# Altium integrated library HCxx.IntLib: 212 symbols (part 2 of 2)
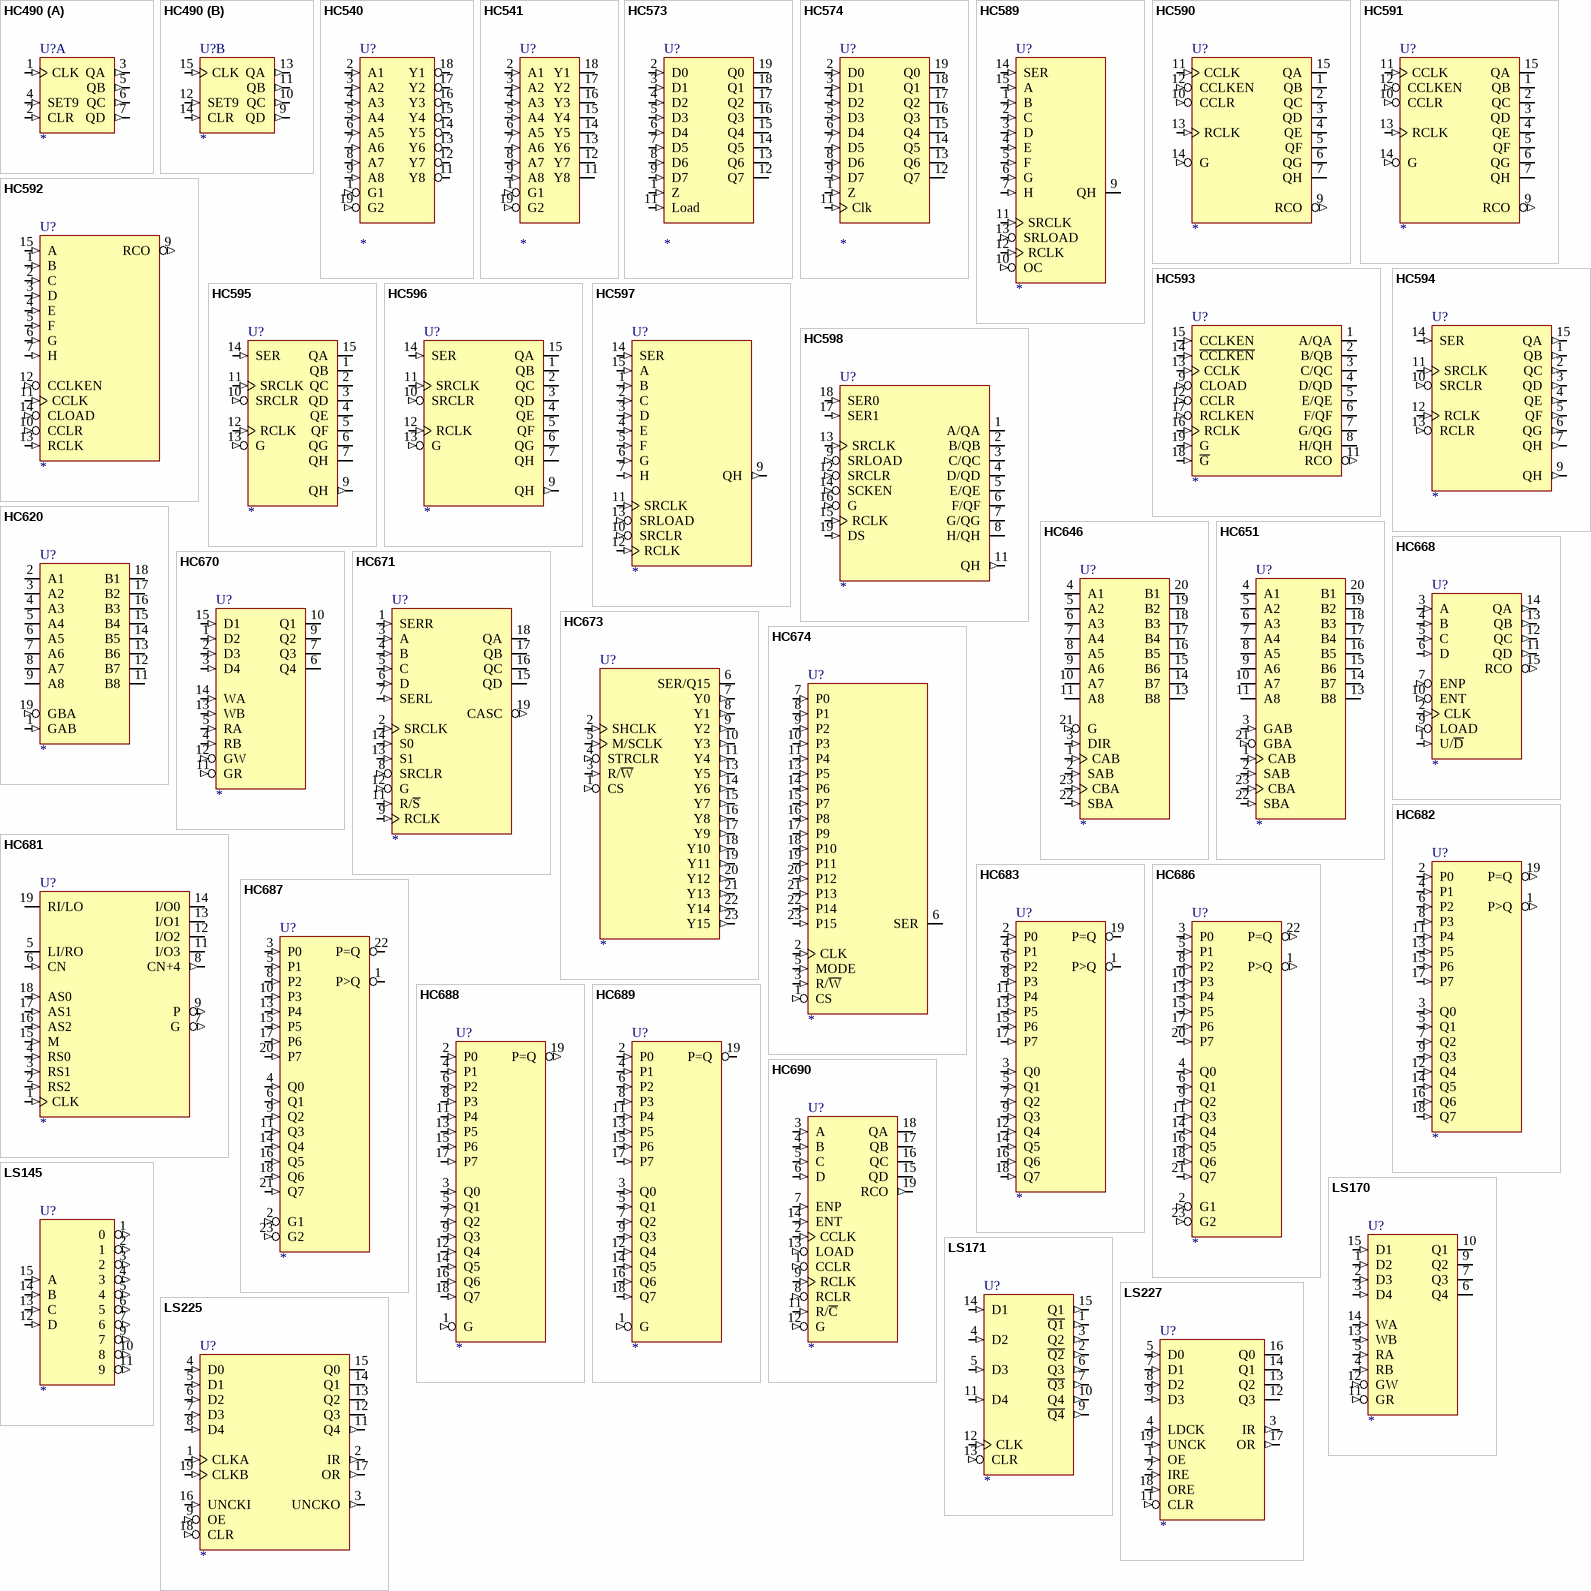
[diagram p9: symbols HC490 to LS227]

## HC686
designator U?
footprint DIL24-300 (Footprint not found)
pins: 1 P>Q (out), 2 G1 (in), 3 P0 (in), 4 Q0 (in), 5 P1 (in), 6 Q1 (in), 8 P2 (in), 9 Q2 (in), 10 P3 (in), 11 Q3 (in), 12 GND (power) hidden to GND, 13 P4 (in), 14 Q4 (in), 15 P5 (in), 16 Q5 (in), 17 P6 (in), 18 Q6 (in), 20 P7 (in), 21 Q7 (in), 22 P=Q (out), 23 G2 (in), 24 VCC (power) hidden to VCC

## HC687
designator U?
footprint DIL24-300 (Footprint not found)
pins: 1 P>Q (oc), 2 G1 (in), 3 P0 (in), 4 Q0 (in), 5 P1 (in), 6 Q1 (in), 8 P2 (in), 9 Q2 (in), 10 P3 (in), 11 Q3 (in), 12 GND (power) hidden to GND, 13 P4 (in), 14 Q4 (in), 15 P5 (in), 16 Q5 (in), 17 P6 (in), 18 Q6 (in), 20 P7 (in), 21 Q7 (in), 22 P=Q (oc), 23 G2 (in), 24 VCC (power) hidden to VCC

## HC688
designator U?
footprint DIL20-300
pins: 1 G (in), 2 P0 (in), 3 Q0 (in), 4 P1 (in), 5 Q1 (in), 6 P2 (in), 7 Q2 (in), 8 P3 (in), 9 Q3 (in), 10 GND (power) hidden to GND, 11 P4 (in), 12 Q4 (in), 13 P5 (in), 14 Q5 (in), 15 P6 (in), 16 Q6 (in), 17 P7 (in), 18 Q7 (in), 19 P=Q (out), 20 VCC (power) hidden to VCC

## HC689
designator U?
footprint DIL20-300
pins: 1 G (in), 2 P0 (in), 3 Q0 (in), 4 P1 (in), 5 Q1 (in), 6 P2 (in), 7 Q2 (in), 8 P3 (in), 9 Q3 (in), 10 GND (power) hidden to GND, 11 P4 (in), 12 Q4 (in), 13 P5 (in), 14 Q5 (in), 15 P6 (in), 16 Q6 (in), 17 P7 (in), 18 Q7 (in), 19 P=Q (oc), 20 VCC (power) hidden to VCC

## HC690
designator U?
footprint DIL20-300
pins: 1 CCLR (in), 2 CCLK (in), 3 A (in), 4 B (in), 5 C (in), 6 D (in), 7 ENP (in), 8 RCLR (in), 9 RCLK (in), 10 GND (power) hidden to GND, 11 R/~{C} (in), 12 G (in), 13 LOAD (in), 14 ENT (in), 15 QD (hiz), 16 QC (hiz), 17 QB (hiz), 18 QA (hiz), 19 RCO (out), 20 VCC (power) hidden to VCC

## LS145
designator U?
footprint DIL16-300
pins: 1 0 (out), 2 1 (out), 3 2 (out), 4 3 (out), 5 4 (out), 6 5 (out), 7 6 (out), 8 GND (power) hidden to GND, 9 7 (out), 10 8 (out), 11 9 (out), 12 D (in), 13 C (in), 14 B (in), 15 A (in), 16 VCC (power) hidden to VCC

## LS170
designator U?
footprint DIL16-300
pins: 1 D2 (in), 2 D3 (in), 3 D4 (in), 4 RB (in), 5 RA (in), 6 Q4 (oc), 7 Q3 (oc), 8 GND (power) hidden to GND, 9 Q2 (oc), 10 Q1 (oc), 11 GR (in), 12 GW (in), 13 WB (in), 14 WA (in), 15 D1 (in), 16 VCC (power) hidden to VCC

## LS171
designator U?
footprint DIL16-300
pins: 1 ~{Q1} (out), 2 ~{Q2} (out), 3 Q2 (out), 4 D2 (in), 5 D3 (in), 6 Q3 (out), 7 ~{Q3} (out), 8 GND (power) hidden to GND, 9 ~{Q4} (out), 10 Q4 (out), 11 D4 (in), 12 CLK (in), 13 CLR (in), 14 D1 (in), 15 Q1 (out), 16 VCC (power) hidden to VCC

## LS225
designator U?
footprint DIL20-300
pins: 1 CLKA (in), 2 IR (out), 3 UNCKO (out), 4 D0 (in), 5 D1 (in), 6 D2 (in), 7 D3 (in), 8 D4 (in), 9 OE (in), 10 GND (power) hidden to GND, 11 Q4 (out), 12 Q3 (oc), 13 Q2 (oc), 14 Q1 (oc), 15 Q0 (oc), 16 UNCKI (in), 17 OR (out), 18 CLR (in), 19 CLKB (in), 20 VCC (power) hidden to VCC

## LS227
designator U?
footprint DIL20-300
pins: 1 OE (in), 2 IRE (in), 3 IR (out), 4 LDCK (in), 5 D0 (in), 7 D1 (in), 8 D2 (in), 9 D3 (in), 10 GND (power) hidden to GND, 11 CLR (in), 12 Q3 (oc), 13 Q2 (oc), 14 Q1 (oc), 16 Q0 (oc), 17 OR (out), 18 ORE (in), 19 UNCK (in), 20 VCC (power) hidden to VCC

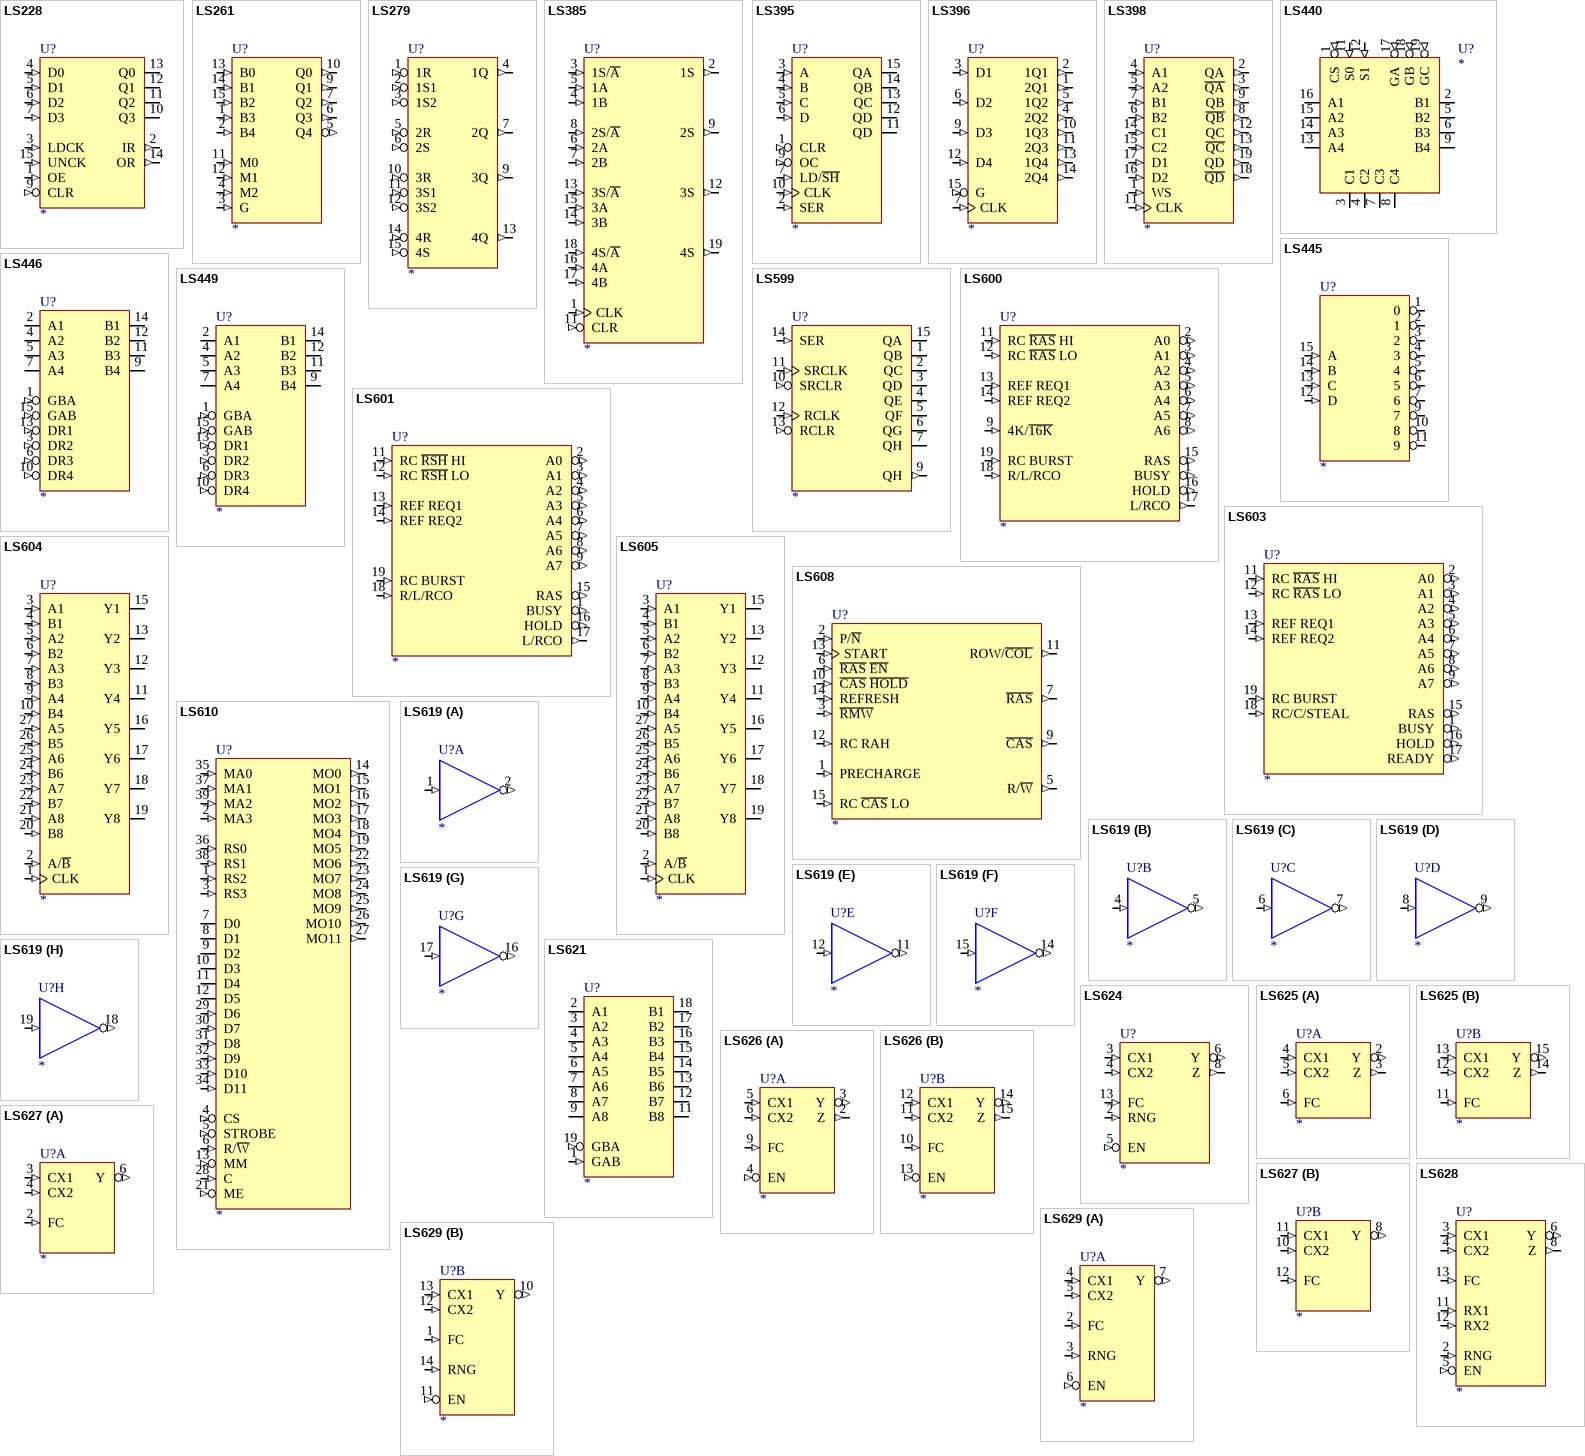
[diagram p7: symbols LS228 to LS629]

## LS228
designator U?
footprint DIL16-300
pins: 1 OE (in), 2 IR (out), 3 LDCK (in), 4 D0 (in), 5 D1 (in), 6 D2 (in), 7 D3 (in), 8 GND (power) hidden to GND, 9 CLR (in), 10 Q3 (oc), 11 Q2 (oc), 12 Q1 (oc), 13 Q0 (oc), 14 OR (out), 15 UNCK (in), 16 VCC (power) hidden to VCC

## LS261
designator U?
footprint DIL16-300
pins: 1 B3 (in), 2 B4 (in), 3 G (in), 4 M2 (in), 5 Q4 (out), 6 Q3 (out), 7 Q2 (out), 8 GND (power) hidden to GND, 9 Q1 (out), 10 Q0 (out), 11 M0 (in), 12 M1 (in), 13 B0 (in), 14 B1 (in), 15 B2 (in), 16 VCC (power) hidden to VCC

## LS279
designator U?
footprint DIL16-300
pins: 1 1R (in), 2 1S1 (in), 3 1S2 (in), 4 1Q (out), 5 2R (in), 6 2S (in), 7 2Q (out), 8 GND (power) hidden to GND, 9 3Q (out), 10 3R (in), 11 3S1 (in), 12 3S2 (in), 13 4Q (out), 14 4R (in), 15 4S (in), 16 VCC (power) hidden to VCC

## LS385
designator U?
footprint DIL20-300
pins: 1 CLK (in), 2 1S (out), 3 1S/~{A} (in), 4 1B (in), 5 1A (in), 6 2A (in), 7 2B (in), 8 2S/~{A} (in), 9 2S (out), 10 GND (power) hidden to GND, 11 CLR (in), 12 3S (out), 13 3S/~{A} (in), 14 3B (in), 15 3A (in), 16 4A (in), 17 4B (in), 18 4S/~{A} (in), 19 4S (out), 20 VCC (power) hidden to VCC

## LS395
designator U?
footprint DIL16-300
pins: 1 CLR (in), 2 SER (in), 3 A (in), 4 B (in), 5 C (in), 6 D (in), 7 LD/~{SH} (in), 8 GND (power) hidden to GND, 9 OC (in), 10 CLK (in), 11 QD (hiz), 12 QD (hiz), 13 QC (hiz), 14 QB (hiz), 15 QA (hiz), 16 VCC (power) hidden to VCC

## LS396
designator U?
footprint DIL16-300
pins: 1 2Q1 (out), 2 1Q1 (out), 3 D1 (in), 4 2Q2 (out), 5 1Q2 (out), 6 D2 (in), 7 CLK (in), 8 GND (power) hidden to GND, 9 D3 (in), 10 1Q3 (out), 11 2Q3 (out), 12 D4 (in), 13 1Q4 (out), 14 2Q4 (out), 15 G (in), 16 VCC (power) hidden to VCC

## LS398
designator U?
footprint DIL20-300
pins: 1 WS (in), 2 QA (out), 3 ~{QA} (out), 4 A1 (in), 5 A2 (in), 6 B2 (in), 7 B1 (in), 8 ~{QB} (out), 9 QB (out), 10 GND (power) hidden to GND, 11 CLK (in), 12 QC (out), 13 ~{QC} (out), 14 C1 (in), 15 C2 (in), 16 D2 (in), 17 D1 (in), 18 ~{QD} (out), 19 QD (out), 20 VCC (power) hidden to VCC

## LS440
designator U?
footprint DIL20-300
pins: 1 CS (in), 2 B1 (io), 3 C1 (io), 4 C2 (io), 5 B2 (io), 6 B3 (io), 7 C3 (io), 8 C4 (io), 9 B4 (io), 10 GND (power) hidden to GND, 11 S0 (in), 12 S1 (in), 13 A4 (io), 14 A3 (io), 15 A2 (io), 16 A1 (io), 17 GA (in), 18 GB (in), 19 GC (in), 20 VCC (power) hidden to VCC

## LS445
designator U?
footprint DIL16-300
pins: 1 0 (oc), 2 1 (oc), 3 2 (oc), 4 3 (oc), 5 4 (oc), 6 5 (oc), 7 6 (oc), 8 GND (power) hidden to GND, 9 7 (oc), 10 8 (oc), 11 9 (oc), 12 D (in), 13 C (in), 14 B (in), 15 A (in), 16 VCC (power) hidden to VCC

## LS446
designator U?
footprint DIL16-300
pins: 1 GBA (in), 2 A1 (io), 3 DR2 (in), 4 A2 (io), 5 A3 (io), 6 DR3 (in), 7 A4 (io), 8 GND (power) hidden to GND, 9 B4 (io), 10 DR4 (in), 11 B3 (io), 12 B2 (io), 13 DR1 (in), 14 B1 (io), 15 GAB (in), 16 VCC (power) hidden to VCC

## LS449
designator U?
footprint DIL16-300
pins: 1 GBA (in), 2 A1 (io), 3 DR2 (in), 4 A2 (io), 5 A3 (io), 6 DR3 (in), 7 A4 (io), 8 GND (power) hidden to GND, 9 B4 (io), 10 DR4 (in), 11 B3 (io), 12 B2 (io), 13 DR1 (in), 14 B1 (io), 15 GAB (in), 16 VCC (power) hidden to VCC

## LS599
designator U?
footprint DIL16-300
pins: 1 QB (oc), 2 QC (oc), 3 QD (oc), 4 QE (oc), 5 QF (oc), 6 QG (oc), 7 QH (oc), 8 GND (power) hidden to GND, 9 QH (out), 10 SRCLR (in), 11 SRCLK (in), 12 RCLK (in), 13 RCLR (in), 14 SER (in), 15 QA (oc), 16 VCC (power) hidden to VCC

## LS600
designator U?
footprint DIL20-300
pins: 1 BUSY (out), 2 A0 (out), 3 A1 (out), 4 A2 (out), 5 A3 (out), 6 A4 (out), 7 A5 (out), 8 A6 (out), 9 4K/~{16K} (in), 10 GND (power) hidden to GND, 11 RC ~{RAS} HI (in), 12 RC ~{RAS} LO (in), 13 REF REQ1 (in), 14 REF REQ2 (in), 15 RAS (out), 16 HOLD (out), 17 L/RCO (out), 18 R/L/RCO (in), 19 RC BURST (in), 20 VCC (power) hidden to VCC

## LS601
designator U?
footprint DIL20-300
pins: 1 BUSY (out), 2 A0 (out), 3 A1 (out), 4 A2 (out), 5 A3 (out), 6 A4 (out), 7 A5 (out), 8 A6 (out), 9 A7 (out), 10 GND (power) hidden to GND, 11 RC ~{RSH} HI (in), 12 RC ~{RSH} LO (in), 13 REF REQ1 (in), 14 REF REQ2 (in), 15 RAS (out), 16 HOLD (out), 17 L/RCO (out), 18 R/L/RCO (in), 19 RC BURST (in), 20 VCC (power) hidden to VCC

## LS603
designator U?
footprint DIL20-300
pins: 1 BUSY (out), 2 A0 (out), 3 A1 (out), 4 A2 (out), 5 A3 (out), 6 A4 (out), 7 A5 (out), 8 A6 (out), 9 A7 (out), 10 GND (power) hidden to GND, 11 RC ~{RAS} HI (in), 12 RC ~{RAS} LO (in), 13 REF REQ1 (in), 14 REF REQ2 (in), 15 RAS (out), 16 HOLD (out), 17 READY (out), 18 RC/C/STEAL (in), 19 RC BURST (in), 20 VCC (power) hidden to VCC

## LS604
designator U?
footprint DIL28-300 (Footprint not found)
pins: 1 CLK (in), 2 A/~{B} (in), 3 A1 (in), 4 B1 (in), 5 A2 (in), 6 B2 (in), 7 A3 (in), 8 B3 (in), 9 A4 (in), 10 B4 (in), 11 Y4 (hiz), 12 Y3 (hiz), 13 Y2 (hiz), 14 GND (power) hidden to GND, 15 Y1 (hiz), 16 Y5 (hiz), 17 Y6 (hiz), 18 Y7 (hiz), 19 Y8 (hiz), 20 B8 (in), 21 A8 (in), 22 B7 (in), 23 A7 (in), 24 B6 (in), 25 A6 (in), 26 B5 (in), 27 A5 (in), 28 VCC (power) hidden to VCC

## LS605
designator U?
footprint DIL28-300 (Footprint not found)
pins: 1 CLK (in), 2 A/~{B} (in), 3 A1 (in), 4 B1 (in), 5 A2 (in), 6 B2 (in), 7 A3 (in), 8 B3 (in), 9 A4 (in), 10 B4 (in), 11 Y4 (oc), 12 Y3 (oc), 13 Y2 (oc), 14 GND (power) hidden to GND, 15 Y1 (oc), 16 Y5 (oc), 17 Y6 (oc), 18 Y7 (oc), 19 Y8 (oc), 20 B8 (in), 21 A8 (in), 22 B7 (in), 23 A7 (in), 24 B6 (in), 25 A6 (in), 26 B5 (in), 27 A5 (in), 28 VCC (power) hidden to VCC

## LS608
designator U?
footprint DIL16-300
pins: 1 PRECHARGE (in), 2 P/~{N} (in), 3 ~{RMW} (in), 5 R/~{W} (out), 6 ~{RAS} ~{EN} (in), 7 ~{RAS} (out), 8 GND (power) hidden to GND, 9 ~{CAS} (out), 10 ~{CAS} ~{HOLD} (in), 11 ROW/~{COL} (out), 12 RC RAH (in), 13 START (in), 14 REFRESH (in), 15 RC ~{CAS} LO (in), 16 VCC (power) hidden to VCC

## LS610
designator U?
footprint DIL40-600
pins: 1 RS2 (in), 2 MA3 (in), 3 RS3 (in), 4 CS (in), 5 STROBE (in), 6 R/~{W} (in), 7 D0 (io), 8 D1 (io), 9 D2 (io), 10 D3 (io), 11 D4 (io), 12 D5 (io), 13 MM (in), 14 MO0 (out), 15 MO1 (out), 16 MO2 (out), 17 MO3 (out), 18 MO4 (out), 19 MO5 (out), 20 GND (power) hidden to GND, 21 ME (in), 22 MO6 (out), 23 MO7 (out), 24 MO8 (out), 25 MO9 (out), 26 MO10 (out), 27 MO11 (out), 28 C (in), 29 D6 (in), 30 D7 (in), 31 D8 (in), 32 D9 (in), 33 D10 (in), 34 D11 (in), 35 MA0 (in), 36 RS0 (in), 37 MA1 (in), 38 RS1 (in), 39 MA2 (in), 40 VCC (power) hidden to VCC

## LS619
designator U?
footprint DIL20-300
part A pins: 1 I (in), 2 O (out), 10 GND (power) hidden to GND, 20 VCC (power) hidden to VCC
part B pins: 4 I (in), 5 O (out)
part C pins: 6 I (in), 7 O (out)
part D pins: 8 I (in), 9 O (out)
part E pins: 11 O (out), 12 I (in)
part F pins: 14 O (out), 15 I (in)
part G pins: 16 O (out), 17 I (in)
part H pins: 18 O (out), 19 I (in)
1 alternate drawing of the same symbol

## LS621
designator U?
footprint DIL20-300
pins: 1 GAB (in), 2 A1 (oc), 3 A2 (oc), 4 A3 (oc), 5 A4 (oc), 6 A5 (oc), 7 A6 (oc), 8 A7 (oc), 9 A8 (oc), 10 GND (power) hidden to GND, 11 B8 (oc), 12 B7 (oc), 13 B6 (oc), 14 B5 (oc), 15 B4 (oc), 16 B3 (oc), 17 B2 (oc), 18 B1 (oc), 19 GBA (in), 20 VCC (power) hidden to VCC

## LS624
designator U?
footprint DIL14-300
pins: 1 OSCGND (power) hidden to OSCGND, 2 RNG (in), 3 CX1 (in), 4 CX2 (in), 5 EN (in), 6 Y (out), 7 GND (power) hidden to GND, 8 Z (out), 9 VCC (power) hidden to VCC, 13 FC (in), 14 OSCVCC (power) hidden to OSCVCC

## LS625
designator U?
footprint DIL16-300
part A pins: 1 Gnd (power) hidden to GND, 2 Y (out), 3 Z (out), 4 CX1 (in), 5 CX2 (in), 6 FC (in), 7 OSCVCC (power) hidden to OSCVCC, 8 OSCGND (power) hidden to OSCGND, 16 VCC (power) hidden to VCC
part B pins: 9 OSCGND (power) hidden to OSCGND, 10 OSCVCC (power) hidden to OSCVCC, 11 FC (in), 12 CX2 (in), 13 CX1 (in), 14 Z (out), 15 Y (out)

## LS626
designator U?
footprint DIL16-300
part A pins: 1 GND (power) hidden to GND, 2 Z (out), 3 Y (out), 4 EN (in), 5 CX1 (in), 6 CX2 (in), 7 OSCVCC (power) hidden to OSCVCC, 8 OSCGND (power) hidden to OSCGND, 9 FC (in), 16 VCC (power) hidden to VCC
part B pins: 10 FC (in), 11 CX2 (in), 12 CX1 (in), 13 EN (in), 14 Y (out), 15 Z (out)

## LS627
designator U?
footprint DIL14-300
part A pins: 1 OSCVCC (power) hidden to OSCVCC, 2 FC (in), 3 CX1 (in), 4 CX2 (in), 5 OSCGND (power) hidden to OSCGND, 6 Y (out), 7 GND (power) hidden to GND, 14 VCC (power) hidden to VCC
part B pins: 8 Y (out), 9 OSCGND (power) hidden to OSCGND, 10 CX2 (in), 11 CX1 (in), 12 FC (in), 13 OSCVCC (power) hidden to OSCVCC

## LS628
designator U?
footprint DIL14-300
pins: 1 OSCGND (power) hidden to OSCGND, 2 RNG (in), 3 CX1 (in), 4 CX2 (in), 5 EN (in), 6 Y (out), 7 GND (power) hidden to GND, 8 Z (out), 9 VCC (power) hidden to VCC, 11 RX1 (in), 12 RX2 (in), 13 FC (in), 14 OSCVCC (power) hidden to OSCVCC

## LS629
designator U?
footprint DIL16-300
part A pins: 2 FC (in), 3 RNG (in), 4 CX1 (in), 5 CX2 (in), 6 EN (in), 7 Y (out), 8 OSCGND (power) hidden to OSCGND, 9 GND (power) hidden to GND, 15 OSCVCC (power) hidden to OSCVCC, 16 VCC (power) hidden to VCC
part B pins: 1 FC (in), 10 Y (out), 11 EN (in), 12 CX2 (in), 13 CX1 (in), 14 RNG (in)

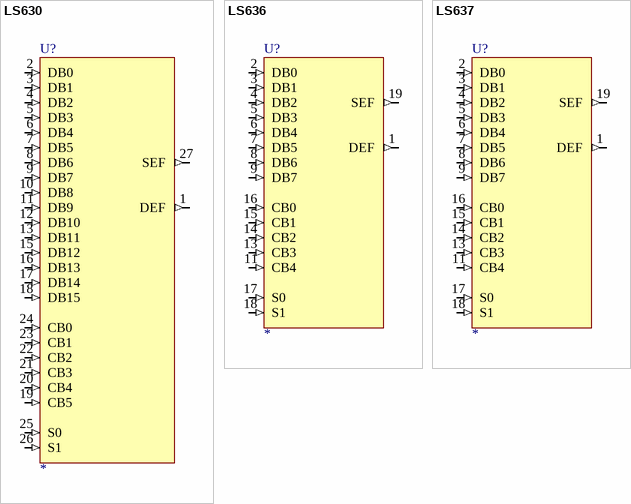
[diagram p8: symbols LS630 to LS637]

## LS630
designator U?
footprint DIL28-300 (Footprint not found)
pins: 1 DEF (out), 2 DB0 (in), 3 DB1 (in), 4 DB2 (in), 5 DB3 (in), 6 DB4 (in), 7 DB5 (in), 8 DB6 (in), 9 DB7 (in), 10 DB8 (in), 11 DB9 (in), 12 DB10 (in), 13 DB11 (in), 14 GND (power) hidden to GND, 15 DB12 (in), 16 DB13 (in), 17 DB14 (in), 18 DB15 (in), 19 CB5 (in), 20 CB4 (in), 21 CB3 (in), 22 CB2 (in), 23 CB1 (in), 24 CB0 (in), 25 S0 (in), 26 S1 (in), 27 SEF (out), 28 VCC (power) hidden to VCC

## LS636
designator U?
footprint DIL20-300
pins: 1 DEF (out), 2 DB0 (in), 3 DB1 (in), 4 DB2 (in), 5 DB3 (in), 6 DB4 (in), 7 DB5 (in), 8 DB6 (in), 9 DB7 (in), 10 GND (power) hidden to GND, 11 CB4 (in), 13 CB3 (in), 14 CB2 (in), 15 CB1 (in), 16 CB0 (in), 17 S0 (in), 18 S1 (in), 19 SEF (out), 20 VCC (power) hidden to VCC

## LS637
designator U?
footprint DIL20-300
pins: 1 DEF (out), 2 DB0 (in), 3 DB1 (in), 4 DB2 (in), 5 DB3 (in), 6 DB4 (in), 7 DB5 (in), 8 DB6 (in), 9 DB7 (in), 10 GND (power) hidden to GND, 11 CB4 (in), 13 CB3 (in), 14 CB2 (in), 15 CB1 (in), 16 CB0 (in), 17 S0 (in), 18 S1 (in), 19 SEF (out), 20 VCC (power) hidden to VCC